# Altium integrated library LEMO Unipole And Multipole Type Connectors.IntLib: 1566 symbols (part 9 of 13) (continued)
## PKB.M1.0SL.NN
designator J?
Fixed receptacle with two nuts (back panel mounting), straight print contacts, Key (B),  series, Multipole Type with 10 Contacts; Manufacturer: LEMO; PartNumber: PKB.M1.0SL.NN; Number of contacts: 10; Contact Diameter: 0.5 mm; Test voltage (kV rms) Contact-Contact: 0.85; Rated Current(A): 3; DatasheetVersion: Jun-14; PackageReference: PKB.M1.0SL.NN; PackageDescription: Fixed receptacle with two nuts (back panel mounting), straight print contacts, Key(B) for Printed Circuit; Supplier 1: Mouser; Supplier Part Number 1: 736-PKBM10SLNN; Supplier 2: Digi-Key; Supplier Part Number 2: PKB.M1.0SL.NN-ND; ComponentLink1Description: Manufacturer URL; ComponentLink1URL: http://www.lemo.com; ComponentLink2Description: Datasheet; ComponentLink2URL: http://intra.lemo.ch/catalog/ROW/UK_English/P_series_catalog.pdf
footprint PKB.M1.0SL.NN (Socket, Female, Height 33.5 mm, Through hole)
pins: 1, 2, 3, 4, 5, 6, 7, 8, 9, 10

## PKB.M1.0SL.NZ
designator J?
Fixed receptacle with 1 nut (without 2nd front nut), Key (B), P series, Multipole Type with 10 Contacts; Manufacturer: LEMO; PartNumber: PKB.M1.0SL.NZ; Number of contacts: 10; Contact Diameter: 0.5 mm; Test voltage (kV rms) Contact-Contact: 0.85; Rated Current(A): 3; DatasheetVersion: Jun-14; PackageReference: PKB.M1.0SL.NZ; PackageDescription: Fixed receptacle with 1 nut (without 2nd front nut), Key(B) for Printed Circuit; Supplier 1: Mouser; Supplier Part Number 1: 736-PKBM10SLNZ; Supplier 2: Digi-Key; Supplier Part Number 2: PKB.M1.0SL.NZ-ND; ComponentLink1Description: Manufacturer URL; ComponentLink1URL: http://www.lemo.com; ComponentLink2Description: Datasheet; ComponentLink2URL: http://intra.lemo.ch/catalog/ROW/UK_English/P_series_catalog.pdf
footprint PKB.M1.0SL.NZ (Socket, Female, Height 25 mm, Through hole)
pins: 1, 2, 3, 4, 5, 6, 7, 8, 9, 10

## PKB.M1.0SL.VG
designator J?
Fixed receptacle with two nuts (back panel mounting), 90° print contacts, Key (B), P series, Multipole Type with 10 Contacts; Manufacturer: LEMO; PartNumber: PKB.M1.0SL.VG; Number of contacts: 10; Contact Diameter: 0.5 mm; Test voltage (kV rms) Contact-Contact: 0.85; Rated Current(A): 3; DatasheetVersion: Jun-14; PackageReference: PKB.M1.0SL.VG; PackageDescription: Fixed receptacle with two nuts (back panel mounting), 90° print contacts, Key(B) for Printed Circuit; Supplier 1: Mouser; Supplier Part Number 1: 736-PKBM10SLVG; Supplier 2: Digi-Key; Supplier Part Number 2: PKB.M1.0SL.VG-ND; ComponentLink1Description: Manufacturer URL; ComponentLink1URL: http://www.lemo.com; ComponentLink2Description: Datasheet; ComponentLink2URL: http://intra.lemo.ch/catalog/ROW/UK_English/P_series_catalog.pdf
footprint PKB.M1.0SL.VG (Socket, Female, Height 33.5 mm, Through hole)
pins: 1, 2, 3, 4, 5, 6, 7, 8, 9, 10

## PKB.M1.0TL.NN
designator J?
Fixed receptacle with two nuts (back panel mounting), straight print contacts, Key (B), P series, Multipole Type with 10 Contacts; Manufacturer: LEMO; PartNumber: PKB.M1.0TL.NN; Number of contacts: 10; Contact Diameter: 0.5 mm; Test voltage (kV rms) Contact-Contact: 0.85; Rated Current(A): 3; DatasheetVersion: Jun-14; PackageReference: PKB.M1.0TL.NN; PackageDescription: Fixed receptacle with two nuts (back panel mounting), straight print contacts, Key(B) for Printed Circuit; Supplier 1: Mouser; Supplier Part Number 1: 736-PKBM10TLNN; Supplier 2: Digi-Key; Supplier Part Number 2: PKB.M1.0TL.NN-ND; ComponentLink1Description: Manufacturer URL; ComponentLink1URL: http://www.lemo.com; ComponentLink2Description: Datasheet; ComponentLink2URL: http://intra.lemo.ch/catalog/ROW/UK_English/P_series_catalog.pdf
footprint PKB.M1.0TL.NN (Socket, Female, Height 33.5 mm, Through hole)
pins: 1, 2, 3, 4, 5, 6, 7, 8, 9, 10

## PKB.M1.4GL.NG
designator J?
Fixed receptacle with two nuts (back panel mounting), straight print contacts, Key (B), P series, Multipole Type with 14 Contacts; Manufacturer: LEMO; PartNumber: PKB.M1.4GL.NG; Number of contacts: 14; Contact Diameter: 0.5 mm; Test voltage (kV rms) Contact-Contact: 0.6; Rated Current(A): 2; DatasheetVersion: Jun-14; PackageReference: PKB.M1.4GL.NG; PackageDescription: Fixed receptacle with two nuts (back panel mounting), straight print contacts, Key(B) for Printed Circuit; ComponentLink1Description: Manufacturer URL; ComponentLink1URL: http://www.lemo.com; ComponentLink2Description: Datasheet; ComponentLink2URL: http://intra.lemo.ch/catalog/ROW/UK_English/P_series_catalog.pdf
footprint PKB.M1.4GL.NG (Socket, Female, Height 33.5 mm, Through hole)
pins: 1, 2, 3, 4, 5, 6, 7, 8, 9, 10, 11, 12, 13, 14

## PKB.M1.4GL.NJ
designator J?
Fixed receptacle with two nuts (back panel mounting), straight print contacts, Key (B),  series, Multipole Type with 14 Contacts; Manufacturer: LEMO; PartNumber: PKB.M1.4GL.NJ; Number of contacts: 14; Contact Diameter: 0.5 mm; Test voltage (kV rms) Contact-Contact: 0.6; Rated Current(A): 2; DatasheetVersion: Jun-14; PackageReference: PKB.M1.4GL.NJ; PackageDescription: Fixed receptacle with two nuts (back panel mounting), straight print contacts, Key(B) for Printed Circuit; ComponentLink1Description: Manufacturer URL; ComponentLink1URL: http://www.lemo.com; ComponentLink2Description: Datasheet; ComponentLink2URL: http://intra.lemo.ch/catalog/ROW/UK_English/P_series_catalog.pdf
footprint PKB.M1.4GL.NJ (Socket, Female, Height 33.5 mm, Through hole)
pins: 1, 2, 3, 4, 5, 6, 7, 8, 9, 10, 11, 12, 13, 14

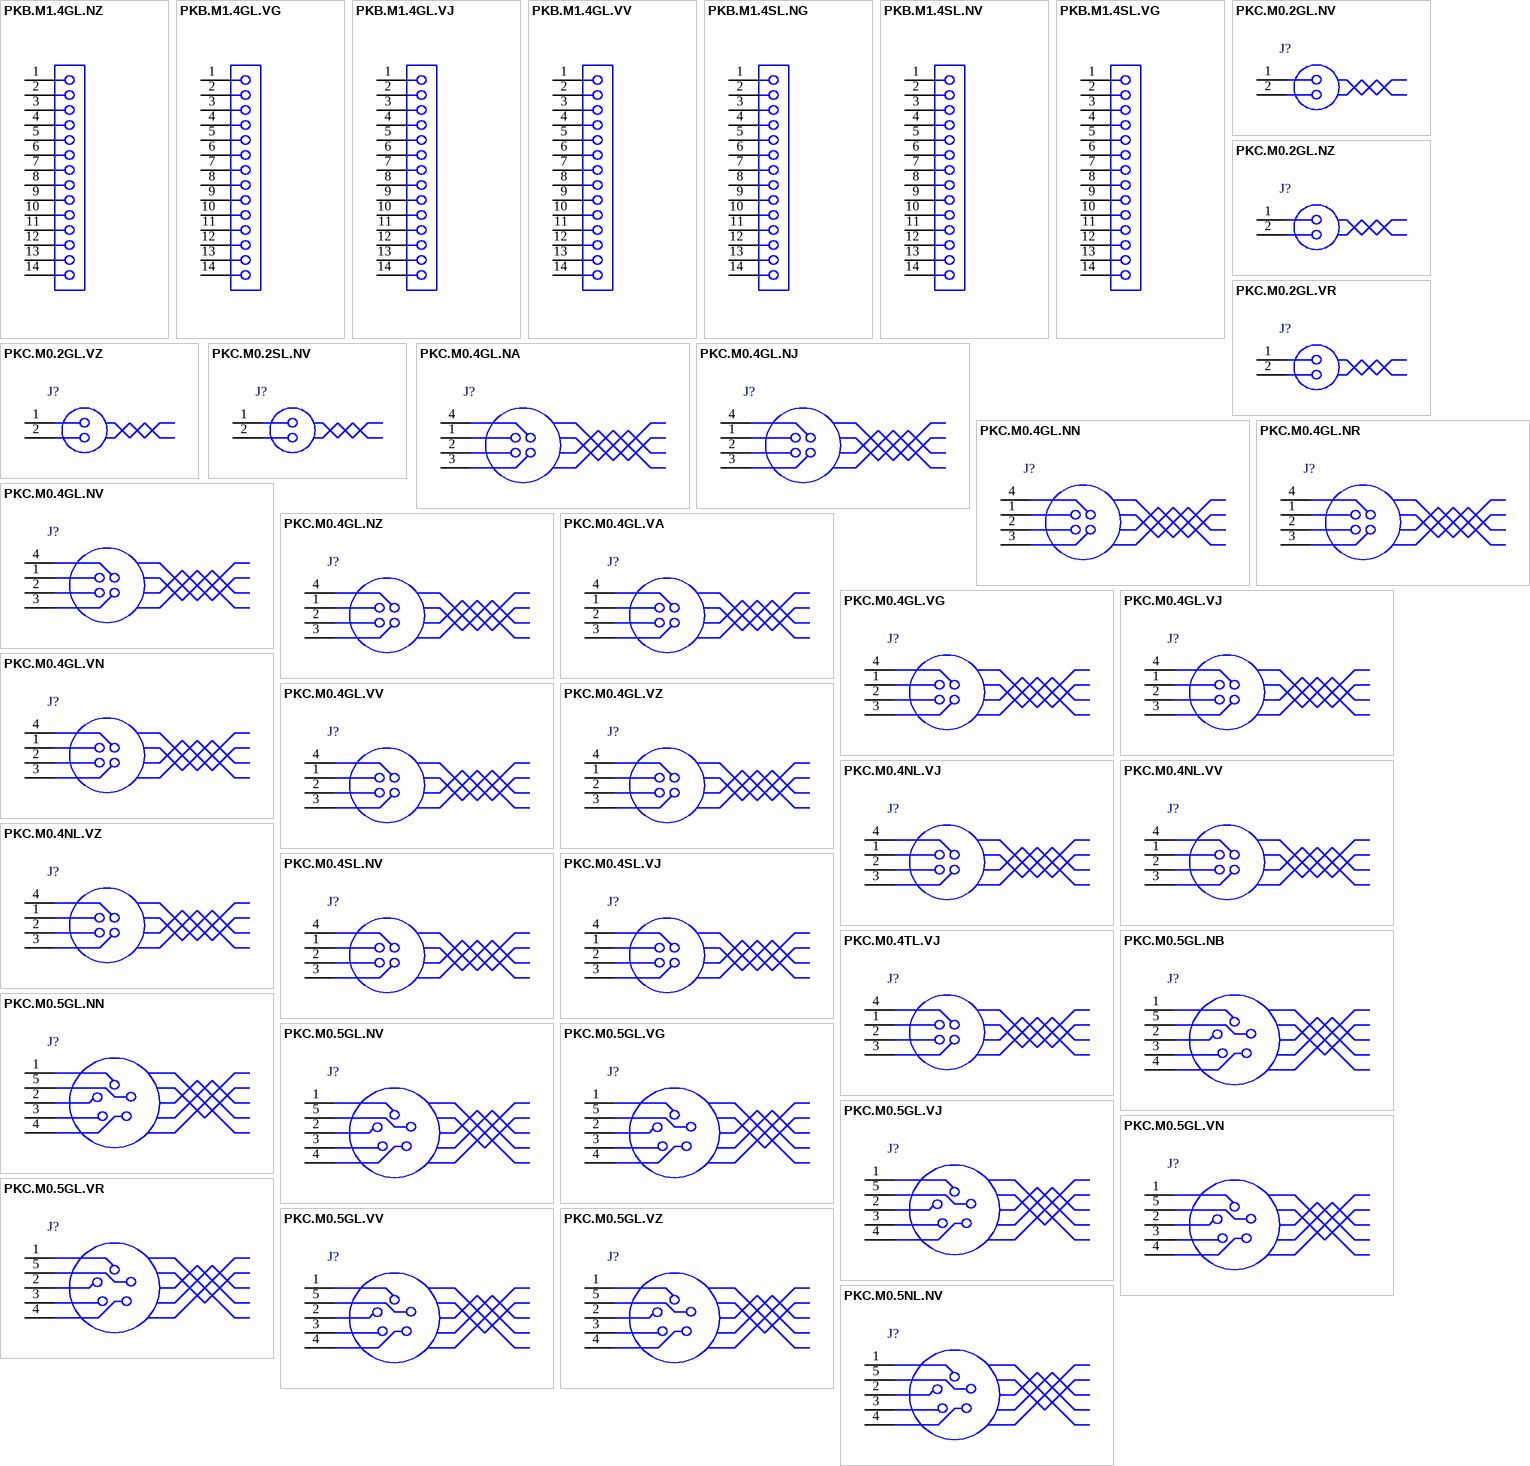
[diagram p30: symbols PKB.M1.4GL.NZ to PKC.M0.5NL.NV]

## PKB.M1.4GL.NZ
designator J?
Fixed receptacle with 1 nut (without 2nd front nut), Key (B), P series, Multipole Type with 14 Contacts; Manufacturer: LEMO; PartNumber: PKB.M1.4GL.NZ; Number of contacts: 14; Contact Diameter: 0.5 mm; Test voltage (kV rms) Contact-Contact: 0.6; Rated Current(A): 2; DatasheetVersion: Jun-14; PackageReference: PKB.M1.4GL.NZ; PackageDescription: Fixed receptacle with 1 nut (without 2nd front nut), Key(B) for Printed Circuit; ComponentLink1Description: Manufacturer URL; ComponentLink1URL: http://www.lemo.com; ComponentLink2Description: Datasheet; ComponentLink2URL: http://intra.lemo.ch/catalog/ROW/UK_English/P_series_catalog.pdf
footprint PKB.M1.4GL.NZ (Socket, Female, Height 25 mm, Through hole)
pins: 1, 2, 3, 4, 5, 6, 7, 8, 9, 10, 11, 12, 13, 14

## PKB.M1.4GL.VG
designator J?
Fixed receptacle with two nuts (back panel mounting), 90° print contacts, Key (B), P series, Multipole Type with 14 Contacts; Manufacturer: LEMO; PartNumber: PKB.M1.4GL.VG; Number of contacts: 14; Contact Diameter: 0.5 mm; Test voltage (kV rms) Contact-Contact: 0.6; Rated Current(A): 2; DatasheetVersion: Jun-14; PackageReference: PKB.M1.4GL.VG; PackageDescription: Fixed receptacle with two nuts (back panel mounting), 90° print contacts, Key(B) for Printed Circuit; ComponentLink1Description: Manufacturer URL; ComponentLink1URL: http://www.lemo.com; ComponentLink2Description: Datasheet; ComponentLink2URL: http://intra.lemo.ch/catalog/ROW/UK_English/P_series_catalog.pdf
footprint PKB.M1.4GL.VG (Socket, Female, Height 33.5 mm, Through hole)
pins: 1, 2, 3, 4, 5, 6, 7, 8, 9, 10, 11, 12, 13, 14

## PKB.M1.4GL.VJ
designator J?
Fixed receptacle with two nuts (back panel mounting), 90° print contacts, Key (B), P series, Multipole Type with 14 Contacts; Manufacturer: LEMO; PartNumber: PKB.M1.4GL.VJ; Number of contacts: 14; Contact Diameter: 0.5 mm; Test voltage (kV rms) Contact-Contact: 0.6; Rated Current(A): 2; DatasheetVersion: Jun-14; PackageReference: PKB.M1.4GL.VJ; PackageDescription: Fixed receptacle with two nuts (back panel mounting), 90° print contacts, Key(B) for Printed Circuit; ComponentLink1Description: Manufacturer URL; ComponentLink1URL: http://www.lemo.com; ComponentLink2Description: Datasheet; ComponentLink2URL: http://intra.lemo.ch/catalog/ROW/UK_English/P_series_catalog.pdf
footprint PKB.M1.4GL.VJ (Socket, Female, Height 33.5 mm, Through hole)
pins: 1, 2, 3, 4, 5, 6, 7, 8, 9, 10, 11, 12, 13, 14

## PKB.M1.4GL.VV
designator J?
Fixed receptacle with two nuts (back panel mounting), 90° print contacts, Key (B), P series, Multipole Type with 14 Contacts; Manufacturer: LEMO; PartNumber: PKB.M1.4GL.VV; Number of contacts: 14; Contact Diameter: 0.5 mm; Test voltage (kV rms) Contact-Contact: 0.6; Rated Current(A): 2; DatasheetVersion: Jun-14; PackageReference: PKB.M1.4GL.VV; PackageDescription: Fixed receptacle with two nuts (back panel mounting), 90° print contacts, Key(B) for Printed Circuit; ComponentLink1Description: Manufacturer URL; ComponentLink1URL: http://www.lemo.com; ComponentLink2Description: Datasheet; ComponentLink2URL: http://intra.lemo.ch/catalog/ROW/UK_English/P_series_catalog.pdf
footprint PKB.M1.4GL.VV (Socket, Female, Height 33.5 mm, Through hole)
pins: 1, 2, 3, 4, 5, 6, 7, 8, 9, 10, 11, 12, 13, 14

## PKB.M1.4SL.NG
designator J?
Fixed receptacle with two nuts (back panel mounting), straight print contacts, Key (B), P series, Multipole Type with 14 Contacts; Manufacturer: LEMO; PartNumber: PKB.M1.4SL.NG; Number of contacts: 14; Contact Diameter: 0.5 mm; Test voltage (kV rms) Contact-Contact: 0.6; Rated Current(A): 2; DatasheetVersion: Jun-14; PackageReference: PKB.M1.4SL.NG; PackageDescription: Fixed receptacle with two nuts (back panel mounting), straight print contacts, Key(B) for Printed Circuit; Supplier 1: Mouser; Supplier Part Number 1: 736-PKBM14SLNG; Supplier 2: Digi-Key; Supplier Part Number 2: PKB.M1.4SL.NG-ND; ComponentLink1Description: Manufacturer URL; ComponentLink1URL: http://www.lemo.com; ComponentLink2Description: Datasheet; ComponentLink2URL: http://intra.lemo.ch/catalog/ROW/UK_English/P_series_catalog.pdf
footprint PKB.M1.4SL.NG (Socket, Female, Height 33.5 mm, Through hole)
pins: 1, 2, 3, 4, 5, 6, 7, 8, 9, 10, 11, 12, 13, 14

## PKB.M1.4SL.NV
designator J?
Fixed receptacle with two nuts (back panel mounting), straight print contacts, Key (B), P series, Multipole Type with 14 Contacts; Manufacturer: LEMO; PartNumber: PKB.M1.4SL.NV; Number of contacts: 14; Contact Diameter: 0.5 mm; Test voltage (kV rms) Contact-Contact: 0.6; Rated Current(A): 2; DatasheetVersion: Jun-14; PackageReference: PKB.M1.4SL.NV; PackageDescription: Fixed receptacle with two nuts (back panel mounting), straight print contacts, Key(B) for Printed Circuit; Supplier 1: Mouser; Supplier Part Number 1: 736-PKBM14SLNV; Supplier 2: Digi-Key; Supplier Part Number 2: PKB.M1.4SL.NV-ND; ComponentLink1Description: Manufacturer URL; ComponentLink1URL: http://www.lemo.com; ComponentLink2Description: Datasheet; ComponentLink2URL: http://intra.lemo.ch/catalog/ROW/UK_English/P_series_catalog.pdf
footprint PKB.M1.4SL.NV (Socket, Female, Height 33.5 mm, Through hole)
pins: 1, 2, 3, 4, 5, 6, 7, 8, 9, 10, 11, 12, 13, 14

## PKB.M1.4SL.VG
designator J?
Fixed receptacle with two nuts (back panel mounting), 90° print contacts, Key (B), P series, Multipole Type with 14 Contacts; Manufacturer: LEMO; PartNumber: PKB.M1.4SL.VG; Number of contacts: 14; Contact Diameter: 0.5 mm; Test voltage (kV rms) Contact-Contact: 0.6; Rated Current(A): 2; DatasheetVersion: Jun-14; PackageReference: PKB.M1.4SL.VG; PackageDescription: Fixed receptacle with two nuts (back panel mounting), 90° print contacts, Key(B) for Printed Circuit; Supplier 1: Mouser; Supplier Part Number 1: 736-PKBM14SLVG; Supplier 2: Digi-Key; Supplier Part Number 2: PKB.M1.4SL.VG-ND; ComponentLink1Description: Manufacturer URL; ComponentLink1URL: http://www.lemo.com; ComponentLink2Description: Datasheet; ComponentLink2URL: http://intra.lemo.ch/catalog/ROW/UK_English/P_series_catalog.pdf
footprint PKB.M1.4SL.VG (Socket, Female, Height 33.5 mm, Through hole)
pins: 1, 2, 3, 4, 5, 6, 7, 8, 9, 10, 11, 12, 13, 14

## PKC.M0.2GL.NV
designator J?
Fixed receptacle with two nuts (back panel mounting), straight print contacts, Key (C), P series, Multipole Type with 2 Contacts; Manufacturer: LEMO; PartNumber: PKC.M0.2GL.NV; Number of contacts: 2; Contact Diameter: 1.3 mm; Test voltage (kV rms) Contact-Contact: 1.2; Rated Current(A): 10; DatasheetVersion: Jun-14; PackageReference: PKC.M0.2GL.NV; PackageDescription: Fixed receptacle with two nuts (back panel mounting), straight print contacts, Key(C) for Printed Circuit; ComponentLink1Description: Manufacturer URL; ComponentLink1URL: http://www.lemo.com; ComponentLink2Description: Datasheet; ComponentLink2URL: http://intra.lemo.ch/catalog/ROW/UK_English/P_series_catalog.pdf
footprint PKC.M0.2GL.NV (Socket, Female, Height 33.5 mm, Through hole)
pins: 1, 2

## PKC.M0.2GL.NZ
designator J?
Fixed receptacle with 1 nut (without 2nd front nut), Key (C), P series, Multipole Type with 2 Contacts; Manufacturer: LEMO; PartNumber: PKC.M0.2GL.NZ; Number of contacts: 2; Contact Diameter: 1.3 mm; Test voltage (kV rms) Contact-Contact: 1.2; Rated Current(A): 10; DatasheetVersion: Jun-14; PackageReference: PKC.M0.2GL.NZ; PackageDescription: Fixed receptacle with 1 nut (without 2nd front nut), Key(C) for Printed Circuit; ComponentLink1Description: Manufacturer URL; ComponentLink1URL: http://www.lemo.com; ComponentLink2Description: Datasheet; ComponentLink2URL: http://intra.lemo.ch/catalog/ROW/UK_English/P_series_catalog.pdf
footprint PKC.M0.2GL.NZ (Socket, Female, Height 25 mm, Through hole)
pins: 1, 2

## PKC.M0.2GL.VR
designator J?
Fixed receptacle with two nuts (back panel mounting), 90° print contacts, Key (C), P series, Multipole Type with 2 Contacts; Manufacturer: LEMO; PartNumber: PKC.M0.2GL.VR; Number of contacts: 2; Contact Diameter: 1.3 mm; Test voltage (kV rms) Contact-Contact: 1.2; Rated Current(A): 10; DatasheetVersion: Jun-14; PackageReference: PKC.M0.2GL.VR; PackageDescription: Fixed receptacle with two nuts (back panel mounting), 90° print contacts, Key(C) for Printed Circuit; ComponentLink1Description: Manufacturer URL; ComponentLink1URL: http://www.lemo.com; ComponentLink2Description: Datasheet; ComponentLink2URL: http://intra.lemo.ch/catalog/ROW/UK_English/P_series_catalog.pdf
footprint PKC.M0.2GL.VR (Socket, Female, Height 33.5 mm, Through hole)
pins: 1, 2

## PKC.M0.2GL.VZ
designator J?
Fixed receptacle with 1 nut (without 2nd front nut), Key (C), P series, Multipole Type with 2 Contacts; Manufacturer: LEMO; PartNumber: PKC.M0.2GL.VZ; Number of contacts: 2; Contact Diameter: 1.3 mm; Test voltage (kV rms) Contact-Contact: 1.2; Rated Current(A): 10; DatasheetVersion: Jun-14; PackageReference: PKC.M0.2GL.VZ; PackageDescription: Fixed receptacle with 1 nut (without 2nd front nut), Key(C) for Printed Circuit; ComponentLink1Description: Manufacturer URL; ComponentLink1URL: http://www.lemo.com; ComponentLink2Description: Datasheet; ComponentLink2URL: http://intra.lemo.ch/catalog/ROW/UK_English/P_series_catalog.pdf
footprint PKC.M0.2GL.VZ (Socket, Female, Height 33.5 mm, Through hole)
pins: 1, 2

## PKC.M0.2SL.NV
designator J?
Fixed receptacle with two nuts (back panel mounting), straight print contacts, Key (C), P series, Multipole Type with 2 Contacts; Manufacturer: LEMO; PartNumber: PKC.M0.2SL.NV; Number of contacts: 2; Contact Diameter: 1.3 mm; Test voltage (kV rms) Contact-Contact: 1.2; Rated Current(A): 10; DatasheetVersion: Jun-14; PackageReference: PKC.M0.2SL.NV; PackageDescription: Fixed receptacle with two nuts (back panel mounting), straight print contacts, Key(C) for Printed Circuit; Supplier 1: Mouser; Supplier Part Number 1: 736-PKCM02SLNV; Supplier 2: Digi-Key; Supplier Part Number 2: PKC.M0.2SL.NV-ND; ComponentLink1Description: Manufacturer URL; ComponentLink1URL: http://www.lemo.com; ComponentLink2Description: Datasheet; ComponentLink2URL: http://intra.lemo.ch/catalog/ROW/UK_English/P_series_catalog.pdf
footprint PKC.M0.2SL.NV (Socket, Female, Height 33.5 mm, Through hole)
pins: 1, 2

## PKC.M0.4GL.NA
designator J?
Fixed receptacle with two nuts (back panel mounting), straight print contacts, Key (C), P series, Multipole Type with 4 Contacts; Manufacturer: LEMO; PartNumber: PKC.M0.4GL.NA; Number of contacts: 4; Contact Diameter: 0.9 mm; Test voltage (kV rms) Contact-Contact: 1.2; Rated Current(A): 8; DatasheetVersion: Jun-14; PackageReference: PKC.M0.4GL.NA; PackageDescription: Fixed receptacle with two nuts (back panel mounting), straight print contacts, Key(C) for Printed Circuit; ComponentLink1Description: Manufacturer URL; ComponentLink1URL: http://www.lemo.com; ComponentLink2Description: Datasheet; ComponentLink2URL: http://intra.lemo.ch/catalog/ROW/UK_English/P_series_catalog.pdf
footprint PKC.M0.4GL.NA (Socket, Female, Height 33.5 mm, Through hole)
pins: 1, 2, 3, 4

## PKC.M0.4GL.NJ
designator J?
Fixed receptacle with two nuts (back panel mounting), straight print contacts, Key (C), P series, Multipole Type with 4 Contacts; Manufacturer: LEMO; PartNumber: PKC.M0.4GL.NJ; Number of contacts: 4; Contact Diameter: 0.9 mm; Test voltage (kV rms) Contact-Contact: 1.2; Rated Current(A): 8; DatasheetVersion: Jun-14; PackageReference: PKC.M0.4GL.NJ; PackageDescription: Fixed receptacle with two nuts (back panel mounting), straight print contacts, Key(C) for Printed Circuit; ComponentLink1Description: Manufacturer URL; ComponentLink1URL: http://www.lemo.com; ComponentLink2Description: Datasheet; ComponentLink2URL: http://intra.lemo.ch/catalog/ROW/UK_English/P_series_catalog.pdf
footprint PKC.M0.4GL.NJ (Socket, Female, Height 33.5 mm, Through hole)
pins: 1, 2, 3, 4

## PKC.M0.4GL.NN
designator J?
Fixed receptacle with two nuts (back panel mounting), straight print contacts, Key (C), P series, Multipole Type with 4 Contacts; Manufacturer: LEMO; PartNumber: PKC.M0.4GL.NN; Number of contacts: 4; Contact Diameter: 0.9 mm; Test voltage (kV rms) Contact-Contact: 1.2; Rated Current(A): 8; DatasheetVersion: Jun-14; PackageReference: PKC.M0.4GL.NN; PackageDescription: Fixed receptacle with two nuts (back panel mounting), straight print contacts, Key(C) for Printed Circuit; ComponentLink1Description: Manufacturer URL; ComponentLink1URL: http://www.lemo.com; ComponentLink2Description: Datasheet; ComponentLink2URL: http://intra.lemo.ch/catalog/ROW/UK_English/P_series_catalog.pdf
footprint PKC.M0.4GL.NN (Socket, Female, Height 33.5 mm, Through hole)
pins: 1, 2, 3, 4

## PKC.M0.4GL.NR
designator J?
Fixed receptacle with two nuts (back panel mounting), straight print contacts, Key (C), P series, Multipole Type with 4 Contacts; Manufacturer: LEMO; PartNumber: PKC.M0.4GL.NR; Number of contacts: 4; Contact Diameter: 0.9 mm; Test voltage (kV rms) Contact-Contact: 1.2; Rated Current(A): 8; DatasheetVersion: Jun-14; PackageReference: PKC.M0.4GL.NR; PackageDescription: Fixed receptacle with two nuts (back panel mounting), straight print contacts, Key(C) for Printed Circuit; ComponentLink1Description: Manufacturer URL; ComponentLink1URL: http://www.lemo.com; ComponentLink2Description: Datasheet; ComponentLink2URL: http://intra.lemo.ch/catalog/ROW/UK_English/P_series_catalog.pdf
footprint PKC.M0.4GL.NR (Socket, Female, Height 33.5 mm, Through hole)
pins: 1, 2, 3, 4

## PKC.M0.4GL.NV
designator J?
Fixed receptacle with two nuts (back panel mounting), straight print contacts, Key (C), P series, Multipole Type with 4 Contacts; Manufacturer: LEMO; PartNumber: PKC.M0.4GL.NV; Number of contacts: 4; Contact Diameter: 0.9 mm; Test voltage (kV rms) Contact-Contact: 1.2; Rated Current(A): 8; DatasheetVersion: Jun-14; PackageReference: PKC.M0.4GL.NV; PackageDescription: Fixed receptacle with two nuts (back panel mounting), straight print contacts, Key(C) for Printed Circuit; ComponentLink1Description: Manufacturer URL; ComponentLink1URL: http://www.lemo.com; ComponentLink2Description: Datasheet; ComponentLink2URL: http://intra.lemo.ch/catalog/ROW/UK_English/P_series_catalog.pdf
footprint PKC.M0.4GL.NV (Socket, Female, Height 33.5 mm, Through hole)
pins: 1, 2, 3, 4

## PKC.M0.4GL.NZ
designator J?
Fixed receptacle with 1 nut (without 2nd front nut), Key (C), P series, Multipole Type with 4 Contacts; Manufacturer: LEMO; PartNumber: PKC.M0.4GL.NZ; Number of contacts: 4; Contact Diameter: 0.9 mm; Test voltage (kV rms) Contact-Contact: 1.2; Rated Current(A): 8; DatasheetVersion: Jun-14; PackageReference: PKC.M0.4GL.NZ; PackageDescription: Fixed receptacle with 1 nut (without 2nd front nut), Key(C) for Printed Circuit; ComponentLink1Description: Manufacturer URL; ComponentLink1URL: http://www.lemo.com; ComponentLink2Description: Datasheet; ComponentLink2URL: http://intra.lemo.ch/catalog/ROW/UK_English/P_series_catalog.pdf
footprint PKC.M0.4GL.NZ (Socket, Female, Height 25 mm, Through hole)
pins: 1, 2, 3, 4

## PKC.M0.4GL.VA
designator J?
Fixed receptacle with two nuts (back panel mounting), 90° print contacts, Key (C), P series, Multipole Type with 4 Contacts; Manufacturer: LEMO; PartNumber: PKC.M0.4GL.VA; Number of contacts: 4; Contact Diameter: 0.9 mm; Test voltage (kV rms) Contact-Contact: 1.2; Rated Current(A): 8; DatasheetVersion: Jun-14; PackageReference: PKC.M0.4GL.VA; PackageDescription: Fixed receptacle with two nuts (back panel mounting), 90° print contacts, Key(C) for Printed Circuit; ComponentLink1Description: Manufacturer URL; ComponentLink1URL: http://www.lemo.com; ComponentLink2Description: Datasheet; ComponentLink2URL: http://intra.lemo.ch/catalog/ROW/UK_English/P_series_catalog.pdf
footprint PKC.M0.4GL.VA (Socket, Female, Height 33.5 mm, Through hole)
pins: 1, 2, 3, 4

## PKC.M0.4GL.VG
designator J?
Fixed receptacle with two nuts (back panel mounting), 90° print contacts, Key (C), P series, Multipole Type with 4 Contacts; Manufacturer: LEMO; PartNumber: PKC.M0.4GL.VG; Number of contacts: 4; Contact Diameter: 0.9 mm; Test voltage (kV rms) Contact-Contact: 1.2; Rated Current(A): 8; DatasheetVersion: Jun-14; PackageReference: PKC.M0.4GL.VG; PackageDescription: Fixed receptacle with two nuts (back panel mounting), 90° print contacts, Key(C) for Printed Circuit; ComponentLink1Description: Manufacturer URL; ComponentLink1URL: http://www.lemo.com; ComponentLink2Description: Datasheet; ComponentLink2URL: http://intra.lemo.ch/catalog/ROW/UK_English/P_series_catalog.pdf
footprint PKC.M0.4GL.VG (Socket, Female, Height 33.5 mm, Through hole)
pins: 1, 2, 3, 4

## PKC.M0.4GL.VJ
designator J?
Fixed receptacle with two nuts (back panel mounting), 90° print contacts, Key (C), P series, Multipole Type with 4 Contacts; Manufacturer: LEMO; PartNumber: PKC.M0.4GL.VJ; Number of contacts: 4; Contact Diameter: 0.9 mm; Test voltage (kV rms) Contact-Contact: 1.2; Rated Current(A): 8; DatasheetVersion: Jun-14; PackageReference: PKC.M0.4GL.VJ; PackageDescription: Fixed receptacle with two nuts (back panel mounting), 90° print contacts, Key(C) for Printed Circuit; ComponentLink1Description: Manufacturer URL; ComponentLink1URL: http://www.lemo.com; ComponentLink2Description: Datasheet; ComponentLink2URL: http://intra.lemo.ch/catalog/ROW/UK_English/P_series_catalog.pdf
footprint PKC.M0.4GL.VJ (Socket, Female, Height 33.5 mm, Through hole)
pins: 1, 2, 3, 4

## PKC.M0.4GL.VN
designator J?
Fixed receptacle with two nuts (back panel mounting), 90° print contacts, Key (C),  series, Multipole Type with 4 Contacts; Manufacturer: LEMO; PartNumber: PKC.M0.4GL.VN; Number of contacts: 4; Contact Diameter: 0.9 mm; Test voltage (kV rms) Contact-Contact: 1.2; Rated Current(A): 8; DatasheetVersion: Jun-14; PackageReference: PKC.M0.4GL.VN; PackageDescription: Fixed receptacle with two nuts (back panel mounting), 90° print contacts, Key(C) for Printed Circuit; ComponentLink1Description: Manufacturer URL; ComponentLink1URL: http://www.lemo.com; ComponentLink2Description: Datasheet; ComponentLink2URL: http://intra.lemo.ch/catalog/ROW/UK_English/P_series_catalog.pdf
footprint PKC.M0.4GL.VN (Socket, Female, Height 33.5 mm, Through hole)
pins: 1, 2, 3, 4

## PKC.M0.4GL.VV
designator J?
Fixed receptacle with two nuts (back panel mounting), 90° print contacts, Key (C), P series, Multipole Type with 4 Contacts; Manufacturer: LEMO; PartNumber: PKC.M0.4GL.VV; Number of contacts: 4; Contact Diameter: 0.9 mm; Test voltage (kV rms) Contact-Contact: 1.2; Rated Current(A): 8; DatasheetVersion: Jun-14; PackageReference: PKC.M0.4GL.VV; PackageDescription: Fixed receptacle with two nuts (back panel mounting), 90° print contacts, Key(C) for Printed Circuit; ComponentLink1Description: Manufacturer URL; ComponentLink1URL: http://www.lemo.com; ComponentLink2Description: Datasheet; ComponentLink2URL: http://intra.lemo.ch/catalog/ROW/UK_English/P_series_catalog.pdf
footprint PKC.M0.4GL.VV (Socket, Female, Through hole)
pins: 1, 2, 3, 4

## PKC.M0.4GL.VZ
designator J?
Fixed receptacle with 1 nut (without 2nd front nut), Key (C), P series, Multipole Type with 4 Contacts; Manufacturer: LEMO; PartNumber: PKC.M0.4GL.VZ; Number of contacts: 4; Contact Diameter: 0.9 mm; Test voltage (kV rms) Contact-Contact: 1.2; Rated Current(A): 8; DatasheetVersion: Jun-14; PackageReference: PKC.M0.4GL.VZ; PackageDescription: Fixed receptacle with 1 nut (without 2nd front nut), Key(C) for Printed Circuit; ComponentLink1Description: Manufacturer URL; ComponentLink1URL: http://www.lemo.com; ComponentLink2Description: Datasheet; ComponentLink2URL: http://intra.lemo.ch/catalog/ROW/UK_English/P_series_catalog.pdf
footprint PKC.M0.4GL.VZ (Socket, Female, Height 33.5 mm, Through hole)
pins: 1, 2, 3, 4

## PKC.M0.4NL.VJ
designator J?
Fixed receptacle with two nuts (back panel mounting), 90° print contacts, Key (C), P series, Multipole Type with 4 Contacts; Manufacturer: LEMO; PartNumber: PKC.M0.4NL.VJ; Number of contacts: 4; Contact Diameter: 0.9 mm; Test voltage (kV rms) Contact-Contact: 1.2; Rated Current(A): 8; DatasheetVersion: Jun-14; PackageReference: PKC.M0.4NL.VJ; PackageDescription: Fixed receptacle with two nuts (back panel mounting), 90° print contacts, Key(C) for Printed Circuit; Supplier 1: Mouser; Supplier Part Number 1: 736-PKCM04NLVJ; Supplier 2: Digi-Key; Supplier Part Number 2: PKC.M0.4NL.VJ-ND; ComponentLink1Description: Manufacturer URL; ComponentLink1URL: http://www.lemo.com; ComponentLink2Description: Datasheet; ComponentLink2URL: http://intra.lemo.ch/catalog/ROW/UK_English/P_series_catalog.pdf
footprint PKC.M0.4NL.VJ (Socket, Female, Height 33.5 mm, Through hole)
pins: 1, 2, 3, 4

## PKC.M0.4NL.VV
designator J?
Fixed receptacle with two nuts (back panel mounting), 90° print contacts, Key (C), P series, Multipole Type with 4 Contacts; Manufacturer: LEMO; PartNumber: PKC.M0.4NL.VV; Number of contacts: 4; Contact Diameter: 0.9 mm; Test voltage (kV rms) Contact-Contact: 1.2; Rated Current(A): 8; DatasheetVersion: Jun-14; PackageReference: PKC.M0.4NL.VV; PackageDescription: Fixed receptacle with two nuts (back panel mounting), 90° print contacts, Key(C) for Printed Circuit; ComponentLink1Description: Manufacturer URL; ComponentLink1URL: http://www.lemo.com; ComponentLink2Description: Datasheet; ComponentLink2URL: http://intra.lemo.ch/catalog/ROW/UK_English/P_series_catalog.pdf
footprint PKC.M0.4NL.VV (Socket, Female, Height 33.5 mm, Through hole)
pins: 1, 2, 3, 4

## PKC.M0.4NL.VZ
designator J?
Fixed receptacle with 1 nut (without 2nd front nut), Key (C), P series, Multipole Type with 4 Contacts; Manufacturer: LEMO; PartNumber: PKC.M0.4NL.VZ; Number of contacts: 4; Contact Diameter: 0.9 mm; Test voltage (kV rms) Contact-Contact: 1.2; Rated Current(A): 8; DatasheetVersion: Jun-14; PackageReference: PKC.M0.4NL.VZ; PackageDescription: Fixed receptacle with 1 nut (without 2nd front nut), Key(C) for Printed Circuit; ComponentLink1Description: Manufacturer URL; ComponentLink1URL: http://www.lemo.com; ComponentLink2Description: Datasheet; ComponentLink2URL: http://intra.lemo.ch/catalog/ROW/UK_English/P_series_catalog.pdf
footprint PKC.M0.4NL.VZ (Socket, Female, Height 33.5 mm, Through hole)
pins: 1, 2, 3, 4

## PKC.M0.4SL.NV
designator J?
Fixed receptacle with two nuts (back panel mounting), straight print contacts, Key (C), P series, Multipole Type with 4 Contacts; Manufacturer: LEMO; PartNumber: PKC.M0.4SL.NV; Number of contacts: 4; Contact Diameter: 0.9 mm; Test voltage (kV rms) Contact-Contact: 1.2; Rated Current(A): 8; DatasheetVersion: Jun-14; PackageReference: PKC.M0.4SL.NV; PackageDescription: Fixed receptacle with two nuts (back panel mounting), straight print contacts, Key(C) for Printed Circuit; ComponentLink1Description: Manufacturer URL; ComponentLink1URL: http://www.lemo.com; ComponentLink2Description: Datasheet; ComponentLink2URL: http://intra.lemo.ch/catalog/ROW/UK_English/P_series_catalog.pdf
footprint PKC.M0.4SL.NV (Socket, Female, Height 33.5 mm, Through hole)
pins: 1, 2, 3, 4